# Altium footprint library JDR2812（公开）.PcbLib: 142 footprints (part 2 of 9)
Each footprint in its own frame and in the unit in brackets; x right, y up, seen from the top. Pads: shape width x height; smd on the part's side, far side on the other; paste and mask are expansions set on the pad; w line width, h text height; cw(c..) or ccw(c..) is an arc to the next point about the centre after c.
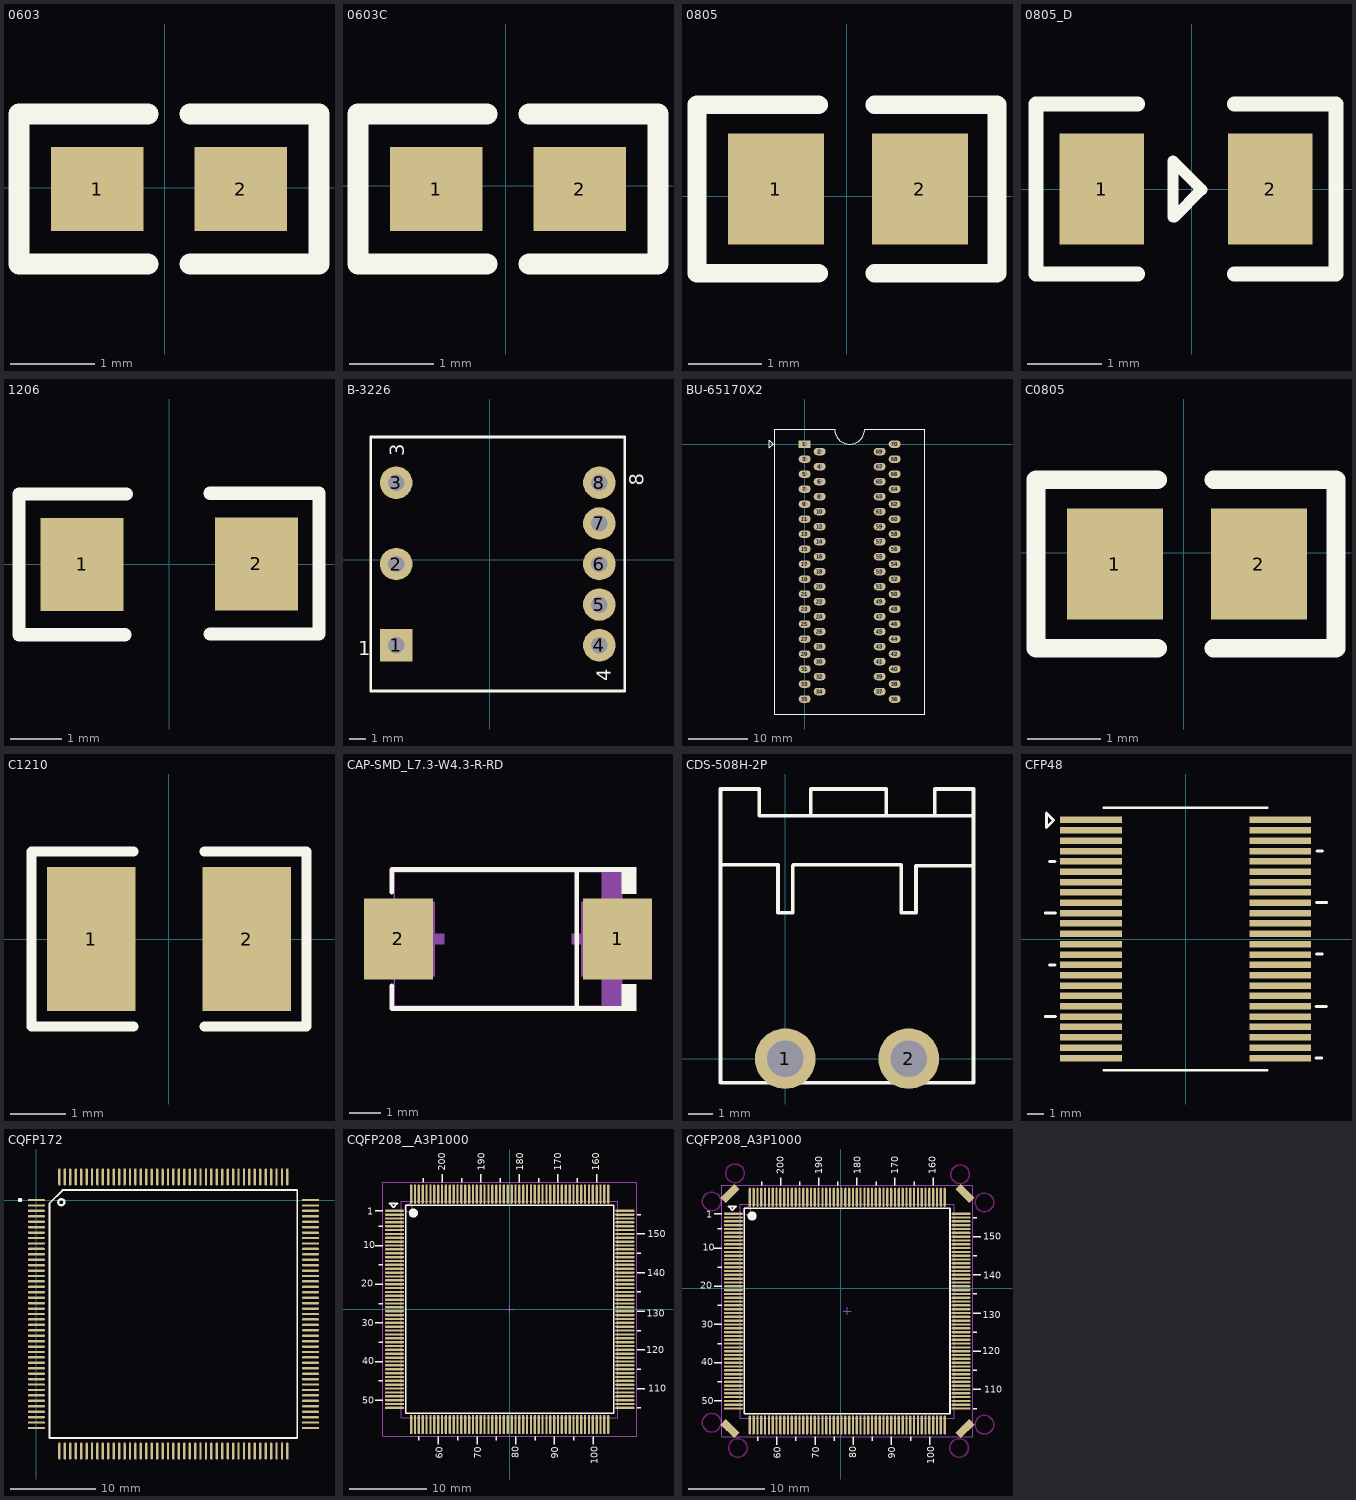
[diagram p1: the footprints below, top view; thin cyan lines are the x and y axes]

## 0603 [mm]
pads (2):
  rect 1.1x1 smd: 1(-0.797,-0.015) 2(0.903,-0.015)
Top Overlay:
  lines w0.254: -0.201,-0.904 -1.725,-0.904 -1.725,0.874 -0.201,0.874 ; 0.307,-0.904 1.831,-0.904 1.831,0.874 0.307,0.874

## 0603C [mm]
pads (2):
  rect 1.1x1 smd: 1(-0.822,-0.041) 2(0.878,-0.041)
Top Overlay:
  lines w0.254: -0.226,-0.93 -1.75,-0.93 -1.75,0.848 -0.226,0.848 ; 0.282,-0.93 1.806,-0.93 1.806,0.848 0.282,0.848

## 0805 [mm]
pads (2):
  rect 1.3x1.5 smd: 1(-0.96,0.102) 2(0.991,0.102)
Top Overlay:
  lines w0.254: -0.381,-1.041 -2.029,-1.041 -2.029,1.245 -0.381,1.245 ; 0.381,-1.041 2.037,-1.041 2.037,1.245 0.381,1.245

## 0805_D [mil]
pads (2):
  rect 45x59.05 smd: 1(-48,0) 2(42,0)
Top Overlay:
  lines w5.91: -10,-15 -10,15 5.39,-0.39 -9.23,-15
  lines w7.87: -28.75,-45.28 -83,-45.28 -83,45.28 -28.75,45.28 ; 22.75,-45.28 77,-45.28 77,45.28 22.75,45.28

## 1206 [mm]
pads (2):
  rect 1.6x1.8 smd: 1(-1.679,-0.003) 2(1.687,0.008)
Top Overlay:
  lines w0.254: -2.898,-1.361 -0.853,-1.361 ; -2.897,-1.349 -2.897,1.353 ; -2.891,1.359 -0.828,1.359 ; -2.82,1.353 -2.815,1.359 ; 0.792,-1.349 2.895,-1.349 2.895,1.372 0.792,1.372

## 2812 [mm]

## B-3226 [mil]
height 68.9
pads (8):
  rect 80x80 hole 40: 1(-230,-210)
  round 80 hole 40: 2(-230,-10) 3(-230,190) 4(270,-210) 5(270,-110) 6(270,-10) 7(270,90) 8(270,190)
Top Overlay:
  lines w7: -292.5,-322.5 332.5,-322.5 332.5,302.5 -292.5,302.5 -292.5,-322.5
  text "1" at -324,-234 h35
  text "3" at -210,255.45 h35
  text "8" at 379.35,182.41 h35
  text "4" at 298.32,-299.12 h35
Bottom Overlay:
  lines w7: -292.5,-322.5 -292.5,302.5 332.5,302.5 332.5,-322.5 -292.5,-322.5
  text "4" at 286.55,-272.99 h35
  text "8" at 341.72,177.72 h35
  text "3" at -254.19,262.29 h35
  text "1" at -309,-235 h35

## BU-65170X2 [mm]
height 1.75
pads (70):
  rect 2.032x1.27 hole 0.9: 1(0,0)
  oval 2.032x1.27 hole 0.9: 2(2.54,-1.27) 3(0,-2.54) 4(2.54,-3.81) 5(0,-5.08) 6(2.54,-6.35) 7(0,-7.62) 8(2.54,-8.89) 9(0,-10.16) 10(2.54,-11.43) 11(0,-12.7) 12(2.54,-13.97) 13(0,-15.24) 14(2.54,-16.51) 15(0,-17.78) 16(2.54,-19.05) 17(0,-20.32) 18(2.54,-21.59) 19(0,-22.86) 20(2.54,-24.13) 21(0,-25.4) 22(2.54,-26.67) 23(0,-27.94) 24(2.54,-29.21) 25(0,-30.48) 26(2.54,-31.75) 27(0,-33.02) 28(2.54,-34.29) 29(0,-35.56) 30(2.54,-36.83) 31(0,-38.1) 32(2.54,-39.37) 33(0,-40.64) 34(2.54,-41.91) 35(0,-43.18) 36(15.24,-43.18) 37(12.7,-41.91) 38(15.24,-40.64) 39(12.7,-39.37) 40(15.24,-38.1) 41(12.7,-36.83) 42(15.24,-35.56) 43(12.7,-34.29) 44(15.24,-33.02) 45(12.7,-31.75) 46(15.24,-30.48) 47(12.7,-29.21) 48(15.24,-27.94) 49(12.7,-26.67) 50(15.24,-25.4) 51(12.7,-24.13) 52(15.24,-22.86) 53(12.7,-21.59) 54(15.24,-20.32) 55(12.7,-19.05) 56(15.24,-17.78) 57(12.7,-16.51) 58(15.24,-15.24) 59(12.7,-13.97) 60(15.24,-12.7) 61(12.7,-11.43) 62(15.24,-10.16) 63(12.7,-8.89) 64(15.24,-7.62) 65(12.7,-6.35) 66(15.24,-5.08) 67(12.7,-3.81) 68(15.24,-2.54) 69(12.7,-1.27) 70(15.24,0)
Top Overlay:
  lines w0.178: -5.994,-0.635 -5.994,0.635 -5.359,0 -5.994,-0.635 ; -5.08,-45.72 -5.08,2.54 5.067,2.54 ccw(c7.62,2.54) 10.173,2.54 20.32,2.54 20.32,-45.72 -5.08,-45.72

## C0805 [mm]
pads (2):
  rect 1.3x1.5 smd: 1(-0.935,-0.152) 2(1.016,-0.152)
Top Overlay:
  lines w0.254: -0.356,-1.295 -2.004,-1.295 -2.004,0.991 -0.356,0.991 ; 0.406,-1.295 2.062,-1.295 2.062,0.991 0.406,0.991

## C1210 [mm]
pads (2):
  rect 1.6x2.6 smd: 1(-1.4,0) 2(1.4,0)
Top Overlay:
  lines w0.178: -0.635,-1.575 -2.476,-1.575 -2.476,1.575 -0.635,1.575 ; 0.635,-1.575 2.476,-1.575 2.476,1.575 0.635,1.575

## CAP-SMD_L7.3-W4.3-R-RD [mm]
pads (2):
  rect 2.207x2.592 smd: 1(-1185.674,-1191.498) 2(-1192.696,-1191.498)
Top Overlay:
  region: -1185.535,-1193.8 -1185.535,-1192.946 -1185.078,-1192.946 -1185.078,-1193.8
  region: -1185.535,-1189.195 -1185.535,-1190.049 -1185.078,-1190.049 -1185.078,-1189.195
  lines w0.152: -1192.911,-1192.997 -1192.911,-1193.724 -1185.459,-1193.724 ; -1192.911,-1189.998 -1192.911,-1189.271 -1185.459,-1189.271 ; -1186.981,-1193.724 -1186.981,-1189.271
Mechanical 6:
  region: -1185.535,-1189.348 -1185.535,-1190.423 -1186.18,-1190.423 -1186.18,-1189.348
  region: -1185.535,-1193.648 -1185.535,-1192.573 -1186.18,-1192.573 -1186.18,-1193.648
  region: -1186.341,-1192.573 -1186.341,-1190.423 -1186.664,-1190.423 -1186.664,-1192.573
  region: -1185.857,-1191.659 -1185.857,-1191.336 -1187.147,-1191.336 -1187.147,-1191.659
  region: -1192.512,-1191.659 -1192.512,-1191.336 -1191.222,-1191.336 -1191.222,-1191.659
Mechanical 15:
  region: -1185.535,-1192.698 -1185.535,-1190.298 -1186.835,-1190.298 -1186.835,-1192.698
  region: -1192.835,-1192.698 -1192.835,-1190.298 -1191.535,-1190.298 -1191.535,-1192.698
  region: -1185.47,-1193.617 -1185.489,-1193.571 -1185.535,-1193.552 -1185.581,-1193.571 -1185.6,-1193.617 -1185.581,-1193.663 -1185.535,-1193.682 -1185.489,-1193.663
  lines w0.051: -1192.835,-1193.648 -1185.535,-1193.648 -1185.535,-1189.348 -1192.835,-1189.348 -1192.835,-1193.648

## CDS-508H-2P [mm]
pads (2):
  round 2.5 hole 1.5: 1(0,0) 2(5.08,0)
Top Overlay:
  lines w0.15: -2.66,7.981 -0.3,7.981 -0.3,6 0.3,6 0.3,7.943 ; 0.338,7.981 4.78,7.981 4.78,6 5.38,6 5.38,7.943 7.719,7.943 ; 1.05,10 1.05,11.1 4.15,11.1 4.15,10 ; 6.15,10 6.15,11.1 7.75,11.1 7.75,-1 -2.67,-1 -2.67,11.1 -1.07,11.1 -1.07,10 7.75,10
3D body "User Library-5EHDR_2P.step": height 8.47, standoff -4, extent -2.46,-1.74 7.54,10.26

## CFP48 [mm]
height 1.2
pads (48):
  rect 3.8x0.4 smd: 1(-5.807,7.302) 2(-5.807,6.667) 3(-5.807,6.032) 4(-5.807,5.397) 5(-5.807,4.763) 6(-5.807,4.127) 7(-5.807,3.492) 8(-5.807,2.857) 9(-5.807,2.222) 10(-5.807,1.587) 11(-5.807,0.953) 12(-5.807,0.318) 13(-5.807,-0.318) 14(-5.807,-0.953) 15(-5.807,-1.587) 16(-5.807,-2.222) 17(-5.807,-2.857) 18(-5.807,-3.492) 19(-5.807,-4.127) 20(-5.807,-4.763) 21(-5.807,-5.397) 22(-5.807,-6.032) 23(-5.807,-6.667) 24(-5.807,-7.302) 25(5.807,-7.302) 26(5.807,-6.667) 27(5.807,-6.032) 28(5.807,-5.397) 29(5.807,-4.763) 30(5.807,-4.127) 31(5.807,-3.492) 32(5.807,-2.857) 33(5.807,-2.222) 34(5.807,-1.587) 35(5.807,-0.953) 36(5.807,-0.318) 37(5.807,0.318) 38(5.807,0.953) 39(5.807,1.587) 40(5.807,2.222) 41(5.807,2.857) 42(5.807,3.492) 43(5.807,4.127) 44(5.807,4.763) 45(5.807,5.397) 46(5.807,6.032) 47(5.807,6.667) 48(5.807,7.302)
Top Overlay:
  lines w0.178: -8.611,-4.75 -7.976,-4.75 ; -8.611,1.6 -7.976,1.6 ; -8.357,-1.6 -8.001,-1.6 ; -8.357,4.75 -8.001,4.75 ; -8.103,7.264 -8.534,6.833 -8.534,7.722 -8.103,7.29 ; -5,-8.05 5,-8.05 ; -5,8.05 5,8.05 ; 8.001,-7.29 8.357,-7.29 ; 8.001,-4.14 8.636,-4.14 ; 8.026,-0.914 8.382,-0.914 ; 8.026,2.235 8.661,2.235 ; 8.052,5.41 8.407,5.41

## CQFP172 [mm]
pads (172):
  oval 2x0.28 smd: 1(0,0) 2(0,-0.635) 3(0,-1.27) 4(0,-1.905) 5(0,-2.54) 6(0,-3.175) 7(0,-3.81) 8(0,-4.445) 9(0,-5.08) 10(0,-5.715) 11(0,-6.35) 12(0,-6.985) 13(0,-7.62) 14(0,-8.255) 15(0,-8.89) 16(0,-9.525) 17(0,-10.16) 18(0,-10.795) 19(0,-11.43) 20(0,-12.065) 21(0,-12.7) 22(0,-13.335) 23(0,-13.97) 24(0,-14.605) 25(0,-15.24) 26(0,-15.875) 27(0,-16.51) 28(0,-17.145) 29(0,-17.78) 30(0,-18.415) 31(0,-19.05) 32(0,-19.685) 33(0,-20.32) 34(0,-20.955) 35(0,-21.59) 36(0,-22.225) 37(0,-22.86) 38(0,-23.495) 39(0,-24.13) 40(0,-24.765) 41(0,-25.4) 42(0,-26.035) 43(0,-26.67) 87(32.07,-26.67) 88(32.07,-26.035) 89(32.07,-25.4) 90(32.07,-24.765) 91(32.07,-24.13) 92(32.07,-23.495) 93(32.07,-22.86) 94(32.07,-22.225) 95(32.07,-21.59) 96(32.07,-20.955) 97(32.07,-20.32) 98(32.07,-19.685) 99(32.07,-19.05) 100(32.07,-18.415) 101(32.07,-17.78) 102(32.07,-17.145) 103(32.07,-16.51) 104(32.07,-15.875) 105(32.07,-15.24) 106(32.07,-14.605) 107(32.07,-13.97) 108(32.07,-13.335) 109(32.07,-12.7) 110(32.07,-12.065) 111(32.07,-11.43) 112(32.07,-10.795) 113(32.07,-10.16) 114(32.07,-9.525) 115(32.07,-8.89) 116(32.07,-8.255) 117(32.07,-7.62) 118(32.07,-6.985) 119(32.07,-6.35) 120(32.07,-5.715) 121(32.07,-5.08) 122(32.07,-4.445) 123(32.07,-3.81) 124(32.07,-3.175) 125(32.07,-2.54) 126(32.07,-1.905) 127(32.07,-1.27) 128(32.07,-0.635) 129(32.07,0)
  oval 0.28x2 smd: 44(2.7,-29.37) 45(3.335,-29.37) 46(3.97,-29.37) 47(4.605,-29.37) 48(5.24,-29.37) 49(5.875,-29.37) 50(6.51,-29.37) 51(7.145,-29.37) 52(7.78,-29.37) 53(8.415,-29.37) 54(9.05,-29.37) 55(9.685,-29.37) 56(10.32,-29.37) 57(10.955,-29.37) 58(11.59,-29.37) 59(12.225,-29.37) 60(12.86,-29.37) 61(13.495,-29.37) 62(14.13,-29.37) 63(14.765,-29.37) 64(15.4,-29.37) 65(16.035,-29.37) 66(16.67,-29.37) 67(17.305,-29.37) 68(17.94,-29.37) 69(18.575,-29.37) 70(19.21,-29.37) 71(19.845,-29.37) 72(20.48,-29.37) 73(21.115,-29.37) 74(21.75,-29.37) 75(22.385,-29.37) 76(23.02,-29.37) 77(23.655,-29.37) 78(24.29,-29.37) 79(24.925,-29.37) 80(25.56,-29.37) 81(26.195,-29.37) 82(26.83,-29.37) 83(27.465,-29.37) 84(28.1,-29.37) 85(28.735,-29.37) 86(29.37,-29.37) 130(29.37,2.7) 131(28.735,2.7) 132(28.1,2.7) 133(27.465,2.7) 134(26.83,2.7) 135(26.195,2.7) 136(25.56,2.7) 137(24.925,2.7) 138(24.29,2.7) 139(23.655,2.7) 140(23.02,2.7) 141(22.385,2.7) 142(21.75,2.7) 143(21.115,2.7) 144(20.48,2.7) 145(19.845,2.7) 146(19.21,2.7) 147(18.575,2.7) 148(17.94,2.7) 149(17.305,2.7) 150(16.67,2.7) 151(16.035,2.7) 152(15.4,2.7) 153(14.765,2.7) 154(14.13,2.7) 155(13.495,2.7) 156(12.86,2.7) 157(12.225,2.7) 158(11.59,2.7) 159(10.955,2.7) 160(10.32,2.7) 161(9.685,2.7) 162(9.05,2.7) 163(8.415,2.7) 164(7.78,2.7) 165(7.145,2.7) 166(6.51,2.7) 167(5.875,2.7) 168(5.24,2.7) 169(4.605,2.7) 170(3.97,2.7) 171(3.335,2.7) 172(2.7,2.7)
Top Overlay:
  circle w0.254: c2.921,-0.254 r0.359
  circle w0.254: c-1.905,0 r0.127
  lines w0.2: 1.535,-27.835 30.535,-27.835 30.535,1.165 3.07,1.165 1.535,-0.37 1.535,-27.835

## CQFP208__A3P1000 [mm]
pads (208):
  oval 2.5x0.3 smd: 1(-14.9,12.75) 2(-14.9,12.25) 3(-14.9,11.75) 4(-14.9,11.25) 5(-14.9,10.75) 6(-14.9,10.25) 7(-14.9,9.75) 8(-14.9,9.25) 9(-14.9,8.75) 10(-14.9,8.25) 11(-14.9,7.75) 12(-14.9,7.25) 13(-14.9,6.75) 14(-14.9,6.25) 15(-14.9,5.75) 16(-14.9,5.25) 17(-14.9,4.75) 18(-14.9,4.25) 19(-14.9,3.75) 20(-14.9,3.25) 21(-14.9,2.75) 22(-14.9,2.25) 23(-14.9,1.75) 24(-14.9,1.25) 25(-14.9,0.75) 26(-14.9,0.25) 27(-14.9,-0.25) 28(-14.9,-0.75) 29(-14.9,-1.25) 30(-14.9,-1.75) 31(-14.9,-2.25) 32(-14.9,-2.75) 33(-14.9,-3.25) 34(-14.9,-3.75) 35(-14.9,-4.25) 36(-14.9,-4.75) 37(-14.9,-5.25) 38(-14.9,-5.75) 39(-14.9,-6.25) 40(-14.9,-6.75) 41(-14.9,-7.25) 42(-14.9,-7.75) 43(-14.9,-8.25) 44(-14.9,-8.75) 45(-14.9,-9.25) 46(-14.9,-9.75) 47(-14.9,-10.25) 48(-14.9,-10.75) 49(-14.9,-11.25) 50(-14.9,-11.75) 51(-14.9,-12.25) 52(-14.9,-12.75) 105(14.9,-12.75) 106(14.9,-12.25) 107(14.9,-11.75) 108(14.9,-11.25) 109(14.9,-10.75) 110(14.9,-10.25) 111(14.9,-9.75) 112(14.9,-9.25) 113(14.9,-8.75) 114(14.9,-8.25) 115(14.9,-7.75) 116(14.9,-7.25) 117(14.9,-6.75) 118(14.9,-6.25) 119(14.9,-5.75) 120(14.9,-5.25) 121(14.9,-4.75) 122(14.9,-4.25) 123(14.9,-3.75) 124(14.9,-3.25) 125(14.9,-2.75) 126(14.9,-2.25) 127(14.9,-1.75) 128(14.9,-1.25) 129(14.9,-0.75) 130(14.9,-0.25) 131(14.9,0.25) 132(14.9,0.75) 133(14.9,1.25) 134(14.9,1.75) 135(14.9,2.25) 136(14.9,2.75) 137(14.9,3.25) 138(14.9,3.75) 139(14.9,4.25) 140(14.9,4.75) 141(14.9,5.25) 142(14.9,5.75) 143(14.9,6.25) 144(14.9,6.75) 145(14.9,7.25) 146(14.9,7.75) 147(14.9,8.25) 148(14.9,8.75) 149(14.9,9.25) 150(14.9,9.75) 151(14.9,10.25) 152(14.9,10.75) 153(14.9,11.25) 154(14.9,11.75) 155(14.9,12.25) 156(14.9,12.75)
  oval 0.3x2.5 smd: 53(-12.75,-14.9) 54(-12.25,-14.9) 55(-11.75,-14.9) 56(-11.25,-14.9) 57(-10.75,-14.9) 58(-10.25,-14.9) 59(-9.75,-14.9) 60(-9.25,-14.9) 61(-8.75,-14.9) 62(-8.25,-14.9) 63(-7.75,-14.9) 64(-7.25,-14.9) 65(-6.75,-14.9) 66(-6.25,-14.9) 67(-5.75,-14.9) 68(-5.25,-14.9) 69(-4.75,-14.9) 70(-4.25,-14.9) 71(-3.75,-14.9) 72(-3.25,-14.9) 73(-2.75,-14.9) 74(-2.25,-14.9) 75(-1.75,-14.9) 76(-1.25,-14.9) 77(-0.75,-14.9) 78(-0.25,-14.9) 79(0.25,-14.9) 80(0.75,-14.9) 81(1.25,-14.9) 82(1.75,-14.9) 83(2.25,-14.9) 84(2.75,-14.9) 85(3.25,-14.9) 86(3.75,-14.9) 87(4.25,-14.9) 88(4.75,-14.9) 89(5.25,-14.9) 90(5.75,-14.9) 91(6.25,-14.9) 92(6.75,-14.9) 93(7.25,-14.9) 94(7.75,-14.9) 95(8.25,-14.9) 96(8.75,-14.9) 97(9.25,-14.9) 98(9.75,-14.9) 99(10.25,-14.9) 100(10.75,-14.9) 101(11.25,-14.9) 102(11.75,-14.9) 103(12.25,-14.9) 104(12.75,-14.9) 157(12.75,14.9) 158(12.25,14.9) 159(11.75,14.9) 160(11.25,14.9) 161(10.75,14.9) 162(10.25,14.9) 163(9.75,14.9) 164(9.25,14.9) 165(8.75,14.9) 166(8.25,14.9) 167(7.75,14.9) 168(7.25,14.9) 169(6.75,14.9) 170(6.25,14.9) 171(5.75,14.9) 172(5.25,14.9) 173(4.75,14.9) 174(4.25,14.9) 175(3.75,14.9) 176(3.25,14.9) 177(2.75,14.9) 178(2.25,14.9) 179(1.75,14.9) 180(1.25,14.9) 181(0.75,14.9) 182(0.25,14.9) 183(-0.25,14.9) 184(-0.75,14.9) 185(-1.25,14.9) 186(-1.75,14.9) 187(-2.25,14.9) 188(-2.75,14.9) 189(-3.25,14.9) 190(-3.75,14.9) 191(-4.25,14.9) 192(-4.75,14.9) 193(-5.25,14.9) 194(-5.75,14.9) 195(-6.25,14.9) 196(-6.75,14.9) 197(-7.25,14.9) 198(-7.75,14.9) 199(-8.25,14.9) 200(-8.75,14.9) 201(-9.25,14.9) 202(-9.75,14.9) 203(-10.25,14.9) 204(-10.75,14.9) 205(-11.25,14.9) 206(-11.75,14.9) 207(-12.25,14.9) 208(-12.75,14.9)
Top Overlay:
  circle w0.6: c-12.45,12.45 r0.3
  lines w0.178: -17.419,-11.75 -16.419,-11.75 ; -17.419,-6.75 -16.419,-6.75 ; -17.419,-1.75 -16.419,-1.75 ; -17.419,3.25 -16.419,3.25 ; -17.419,8.25 -16.419,8.25 ; -17.419,12.75 -16.419,12.75 ; -16.919,-9.25 -16.419,-9.25 ; -16.919,-4.25 -16.419,-4.25 ; -16.919,0.75 -16.419,0.75 ; -16.919,5.75 -16.419,5.75 ; -16.919,10.75 -16.419,10.75 ; -11.735,-16.967 -11.735,-16.467 ; -11.209,16.46 -11.209,16.96 ; -9.246,-17.459 -9.246,-16.459 ; -8.709,16.46 -8.709,17.46 ; -6.75,-16.959 -6.75,-16.459 ; -6.209,16.46 -6.209,16.96 ; -4.209,-17.46 -4.209,-16.46 ; -3.75,16.45 -3.75,17.45 ; -1.709,-16.96 -1.709,-16.46 ; -1.209,16.46 -1.209,16.96 ; 0.762,-17.459 0.762,-16.459 ; 1.25,16.45 1.25,17.45 ; 3.291,-16.96 3.291,-16.46 ; 3.791,16.46 3.791,16.96 ; 5.791,-17.46 5.791,-16.46 ; 6.248,16.45 6.248,17.45 ; 8.291,-16.96 8.291,-16.46 ; 8.75,16.442 8.75,16.942 ; 10.791,-17.46 10.791,-16.46 ; 11.266,16.46 11.266,17.46 ; 16.476,-12.75 16.976,-12.75 ; 16.476,-10.25 17.476,-10.25 ; 16.476,-7.75 16.976,-7.75 ; 16.476,-5.25 17.476,-5.25 ; 16.476,-2.75 16.976,-2.75 ; 16.476,-0.25 17.476,-0.25 ; 16.476,2.25 16.976,2.25 ; 16.476,4.75 17.476,4.75 ; 16.476,7.25 16.976,7.25 ; 16.476,9.75 17.476,9.75 ; 16.476,12.25 16.976,12.25
  lines w0.2: -13.45,-13.45 -13.45,13.45 13.45,13.45 13.45,-13.45 -13.45,-13.45
  lines w0.254: -15.519,13.716 -14.529,13.716 -15.016,13.229 -15.032,13.229 -15.519,13.716
  text "170" at 6.68,17.907 h0.89
  text "160" at 11.608,17.907 h0.89
  text "150" at 17.831,9.312 h0.89
  text "140" at 17.798,4.249 h0.89
  text "130" at 17.73,-0.932 h0.89
  text "120" at 17.694,-5.651 h0.89
  text "110" at 17.902,-10.665 h0.89
  text "100" at 11.406,-20.008 h0.89
  text "90" at 6.3,-19.347 h0.89
  text "80" at 1.195,-19.246 h0.89
  text "70" at -3.657,-19.297 h0.89
  text "60" at -8.686,-19.322 h0.89
  text "50" at -19.05,-12.192 h0.89
  text "40" at -19.101,-7.112 h0.89
  text "30" at -19.126,-2.159 h0.89
  text "10" at -18.923,7.874 h0.89
  text "1" at -18.419,12.25 h0.89
  text "180" at 1.753,17.907 h0.89
  text "190" at -3.251,17.907 h0.89
  text "200" at -8.306,17.907 h0.89
  text "20" at -19.228,2.921 h0.89
Mechanical 13:
  circle w0.1: c-13.1,13.1 r0.5
  lines w0.1: -14,-14 -14,14 14,14 14,-14 -14,-14
Mechanical 15:
  lines w0.1: -0.5,0 0.5,0 ; 0,-0.5 0,0.5 ; -16.45,-16.45 -16.45,16.45 16.45,16.45 16.45,-16.45 -16.45,-16.45
3D body: height 4.1, standoff 0, extent -14,-14 14,14

## CQFP208_A3P1000 [mm]
pads (212):
  oval 2.5x0.3 smd: 1(-14.062,9.778) 2(-14.062,9.278) 3(-14.062,8.778) 4(-14.062,8.278) 5(-14.062,7.778) 6(-14.062,7.278) 7(-14.062,6.778) 8(-14.062,6.278) 9(-14.062,5.778) 10(-14.062,5.278) 11(-14.062,4.778) 12(-14.062,4.278) 13(-14.062,3.778) 14(-14.062,3.278) 15(-14.062,2.778) 16(-14.062,2.278) 17(-14.062,1.778) 18(-14.062,1.278) 19(-14.062,0.778) 20(-14.062,0.278) 21(-14.062,-0.222) 22(-14.062,-0.722) 23(-14.062,-1.222) 24(-14.062,-1.722) 25(-14.062,-2.222) 26(-14.062,-2.722) 27(-14.062,-3.222) 28(-14.062,-3.722) 29(-14.062,-4.222) 30(-14.062,-4.722) 31(-14.062,-5.222) 32(-14.062,-5.722) 33(-14.062,-6.222) 34(-14.062,-6.722) 35(-14.062,-7.222) 36(-14.062,-7.722) 37(-14.062,-8.222) 38(-14.062,-8.722) 39(-14.062,-9.222) 40(-14.062,-9.722) 41(-14.062,-10.222) 42(-14.062,-10.722) 43(-14.062,-11.222) 44(-14.062,-11.722) 45(-14.062,-12.222) 46(-14.062,-12.722) 47(-14.062,-13.222) 48(-14.062,-13.722) 49(-14.062,-14.222) 50(-14.062,-14.722) 51(-14.062,-15.222) 52(-14.062,-15.722) 105(15.738,-15.722) 106(15.738,-15.222) 107(15.738,-14.722) 108(15.738,-14.222) 109(15.738,-13.722) 110(15.738,-13.222) 111(15.738,-12.722) 112(15.738,-12.222) 113(15.738,-11.722) 114(15.738,-11.222) 115(15.738,-10.722) 116(15.738,-10.222) 117(15.738,-9.722) 118(15.738,-9.222) 119(15.738,-8.722) 120(15.738,-8.222) 121(15.738,-7.722) 122(15.738,-7.222) 123(15.738,-6.722) 124(15.738,-6.222) 125(15.738,-5.722) 126(15.738,-5.222) 127(15.738,-4.722) 128(15.738,-4.222) 129(15.738,-3.722) 130(15.738,-3.222) 131(15.738,-2.722) 132(15.738,-2.222) 133(15.738,-1.722) 134(15.738,-1.222) 135(15.738,-0.722) 136(15.738,-0.222) 137(15.738,0.278) 138(15.738,0.778) 139(15.738,1.278) 140(15.738,1.778) 141(15.738,2.278) 142(15.738,2.778) 143(15.738,3.278) 144(15.738,3.778) 145(15.738,4.278) 146(15.738,4.778) 147(15.738,5.278) 148(15.738,5.778) 149(15.738,6.278) 150(15.738,6.778) 151(15.738,7.278) 152(15.738,7.778) 153(15.738,8.278) 154(15.738,8.778) 155(15.738,9.278) 156(15.738,9.778)
  oval 0.3x2.5 smd: 53(-11.912,-17.872) 54(-11.412,-17.872) 55(-10.912,-17.872) 56(-10.412,-17.872) 57(-9.912,-17.872) 58(-9.412,-17.872) 59(-8.912,-17.872) 60(-8.412,-17.872) 61(-7.912,-17.872) 62(-7.412,-17.872) 63(-6.912,-17.872) 64(-6.412,-17.872) 65(-5.912,-17.872) 66(-5.412,-17.872) 67(-4.912,-17.872) 68(-4.412,-17.872) 69(-3.912,-17.872) 70(-3.412,-17.872) 71(-2.912,-17.872) 72(-2.412,-17.872) 73(-1.912,-17.872) 74(-1.412,-17.872) 75(-0.912,-17.872) 76(-0.412,-17.872) 77(0.088,-17.872) 78(0.588,-17.872) 79(1.088,-17.872) 80(1.588,-17.872) 81(2.088,-17.872) 82(2.588,-17.872) 83(3.088,-17.872) 84(3.588,-17.872) 85(4.088,-17.872) 86(4.588,-17.872) 87(5.088,-17.872) 88(5.588,-17.872) 89(6.088,-17.872) 90(6.588,-17.872) 91(7.088,-17.872) 92(7.588,-17.872) 93(8.088,-17.872) 94(8.588,-17.872) 95(9.088,-17.872) 96(9.588,-17.872) 97(10.088,-17.872) 98(10.588,-17.872) 99(11.088,-17.872) 100(11.588,-17.872) 101(12.088,-17.872) 102(12.588,-17.872) 103(13.088,-17.872) 104(13.588,-17.872) 157(13.588,11.928) 158(13.088,11.928) 159(12.588,11.928) 160(12.088,11.928) 161(11.588,11.928) 162(11.088,11.928) 163(10.588,11.928) 164(10.088,11.928) 165(9.588,11.928) 166(9.088,11.928) 167(8.588,11.928) 168(8.088,11.928) 169(7.588,11.928) 170(7.088,11.928) 171(6.588,11.928) 172(6.088,11.928) 173(5.588,11.928) 174(5.088,11.928) 175(4.588,11.928) 176(4.088,11.928) 177(3.588,11.928) 178(3.088,11.928) 179(2.588,11.928) 180(2.088,11.928) 181(1.588,11.928) 182(1.088,11.928) 183(0.588,11.928) 184(0.088,11.928) 185(-0.412,11.928) 186(-0.912,11.928) 187(-1.412,11.928) 188(-1.912,11.928) 189(-2.412,11.928) 190(-2.912,11.928) 191(-3.412,11.928) 192(-3.912,11.928) 193(-4.412,11.928) 194(-4.912,11.928) 195(-5.412,11.928) 196(-5.912,11.928) 197(-6.412,11.928) 198(-6.912,11.928) 199(-7.412,11.928) 200(-7.912,11.928) 201(-8.412,11.928) 202(-8.912,11.928) 203(-9.412,11.928) 204(-9.912,11.928) 205(-10.412,11.928) 206(-10.912,11.928) 207(-11.412,11.928) 208(-11.912,11.928)
  rect 2.54x1.016 smd rot 135: ""(-14.501,-18.352) ""(16.259,12.408)
  rect 2.54x1.016 smd rot 45: ""(-14.501,12.408) ""(16.259,-18.352)
Top Overlay:
  circle w0.6: c-11.612,9.478 r0.3
  lines w0.178: -16.581,-14.722 -15.581,-14.722 ; -16.581,-9.722 -15.581,-9.722 ; -16.581,-4.722 -15.581,-4.722 ; -16.581,0.278 -15.581,0.278 ; -16.581,5.278 -15.581,5.278 ; -16.581,9.778 -15.581,9.778 ; -16.081,-12.222 -15.581,-12.222 ; -16.081,-7.222 -15.581,-7.222 ; -16.081,-2.222 -15.581,-2.222 ; -16.081,2.778 -15.581,2.778 ; -16.081,7.778 -15.581,7.778 ; -10.897,-19.939 -10.897,-19.439 ; -10.371,13.488 -10.371,13.988 ; -8.407,-20.431 -8.407,-19.431 ; -7.871,13.488 -7.871,14.488 ; -5.912,-19.931 -5.912,-19.431 ; -5.371,13.488 -5.371,13.988 ; -3.371,-20.432 -3.371,-19.432 ; -2.912,13.478 -2.912,14.478 ; -0.871,-19.932 -0.871,-19.432 ; -0.371,13.488 -0.371,13.988 ; 1.6,-20.431 1.6,-19.431 ; 2.088,13.478 2.088,14.478 ; 4.129,-19.932 4.129,-19.432 ; 4.629,13.488 4.629,13.988 ; 6.629,-20.432 6.629,-19.432 ; 7.087,13.478 7.087,14.478 ; 9.129,-19.932 9.129,-19.432 ; 9.588,13.47 9.588,13.97 ; 11.629,-20.432 11.629,-19.432 ; 12.104,13.488 12.104,14.488 ; 17.314,-15.722 17.814,-15.722 ; 17.314,-13.222 18.314,-13.222 ; 17.314,-10.722 17.814,-10.722 ; 17.314,-8.222 18.314,-8.222 ; 17.314,-5.722 17.814,-5.722 ; 17.314,-3.222 18.314,-3.222 ; 17.314,-0.722 17.814,-0.722 ; 17.314,1.778 18.314,1.778 ; 17.314,4.278 17.814,4.278 ; 17.314,6.778 18.314,6.778 ; 17.314,9.278 17.814,9.278
  lines w0.2: -12.612,-16.422 14.288,-16.422 14.288,10.478 -12.612,10.478 -12.612,-16.422
  lines w0.254: -14.681,10.744 -14.194,10.257 -14.178,10.257 -13.691,10.744 -14.681,10.744
  text "20" at -18.39,-0.051 h0.89
  text "200" at -7.468,14.935 h0.89
  text "190" at -2.413,14.935 h0.89
  text "180" at 2.591,14.935 h0.89
  text "1" at -17.581,9.278 h0.89
  text "10" at -18.085,4.902 h0.89
  text "30" at -18.288,-5.131 h0.89
  text "40" at -18.263,-10.084 h0.89
  text "50" at -18.212,-15.164 h0.89
  text "60" at -7.848,-22.294 h0.89
  text "70" at -2.818,-22.268 h0.89
  text "80" at 2.033,-22.218 h0.89
  text "90" at 7.138,-22.319 h0.89
  text "100" at 12.244,-22.98 h0.89
  text "110" at 18.741,-13.637 h0.89
  text "120" at 18.532,-8.623 h0.89
  text "130" at 18.568,-3.904 h0.89
  text "140" at 18.637,1.278 h0.89
  text "150" at 18.67,6.34 h0.89
  text "160" at 12.446,14.935 h0.89
  text "170" at 7.518,14.935 h0.89
Keep-Out Layer:
  circle w0.178: c-16.901,-17.577 r1.219
  circle w0.178: c-13.472,-20.879 r1.219
  circle w0.178: c15.484,-20.879 r1.219
  circle w0.178: c18.786,-17.831 r1.219
  circle w0.178: c15.611,14.935 r1.219
  circle w0.178: c18.786,11.252 r1.219
  circle w0.178: c-16.901,11.379 r1.219
  circle w0.178: c-13.853,15.062 r1.219
Mechanical 13:
  circle w0.1: c-12.262,10.128 r0.5
  lines w0.1: -13.162,-16.972 14.838,-16.972 14.838,11.028 -13.162,11.028 -13.162,-16.972
Mechanical 15:
  lines w0.1: 0.338,-2.972 1.338,-2.972 ; 0.838,-3.472 0.838,-2.472 ; -15.612,-19.422 17.288,-19.422 17.288,13.478 -15.612,13.478 -15.612,-19.422
3D body: height 4.1, standoff 0, extent -13.162,-16.972 14.838,11.028